# Altium footprint library BBC_Footprints.PcbLib: 171 footprints (part 5 of 11)
Each footprint in its own frame and in the unit in brackets; x right, y up, seen from the top. Pads: shape width x height; smd on the part's side, far side on the other; paste and mask are expansions set on the pad; w line width, h text height; cw(c..) or ccw(c..) is an arc to the next point about the centre after c.
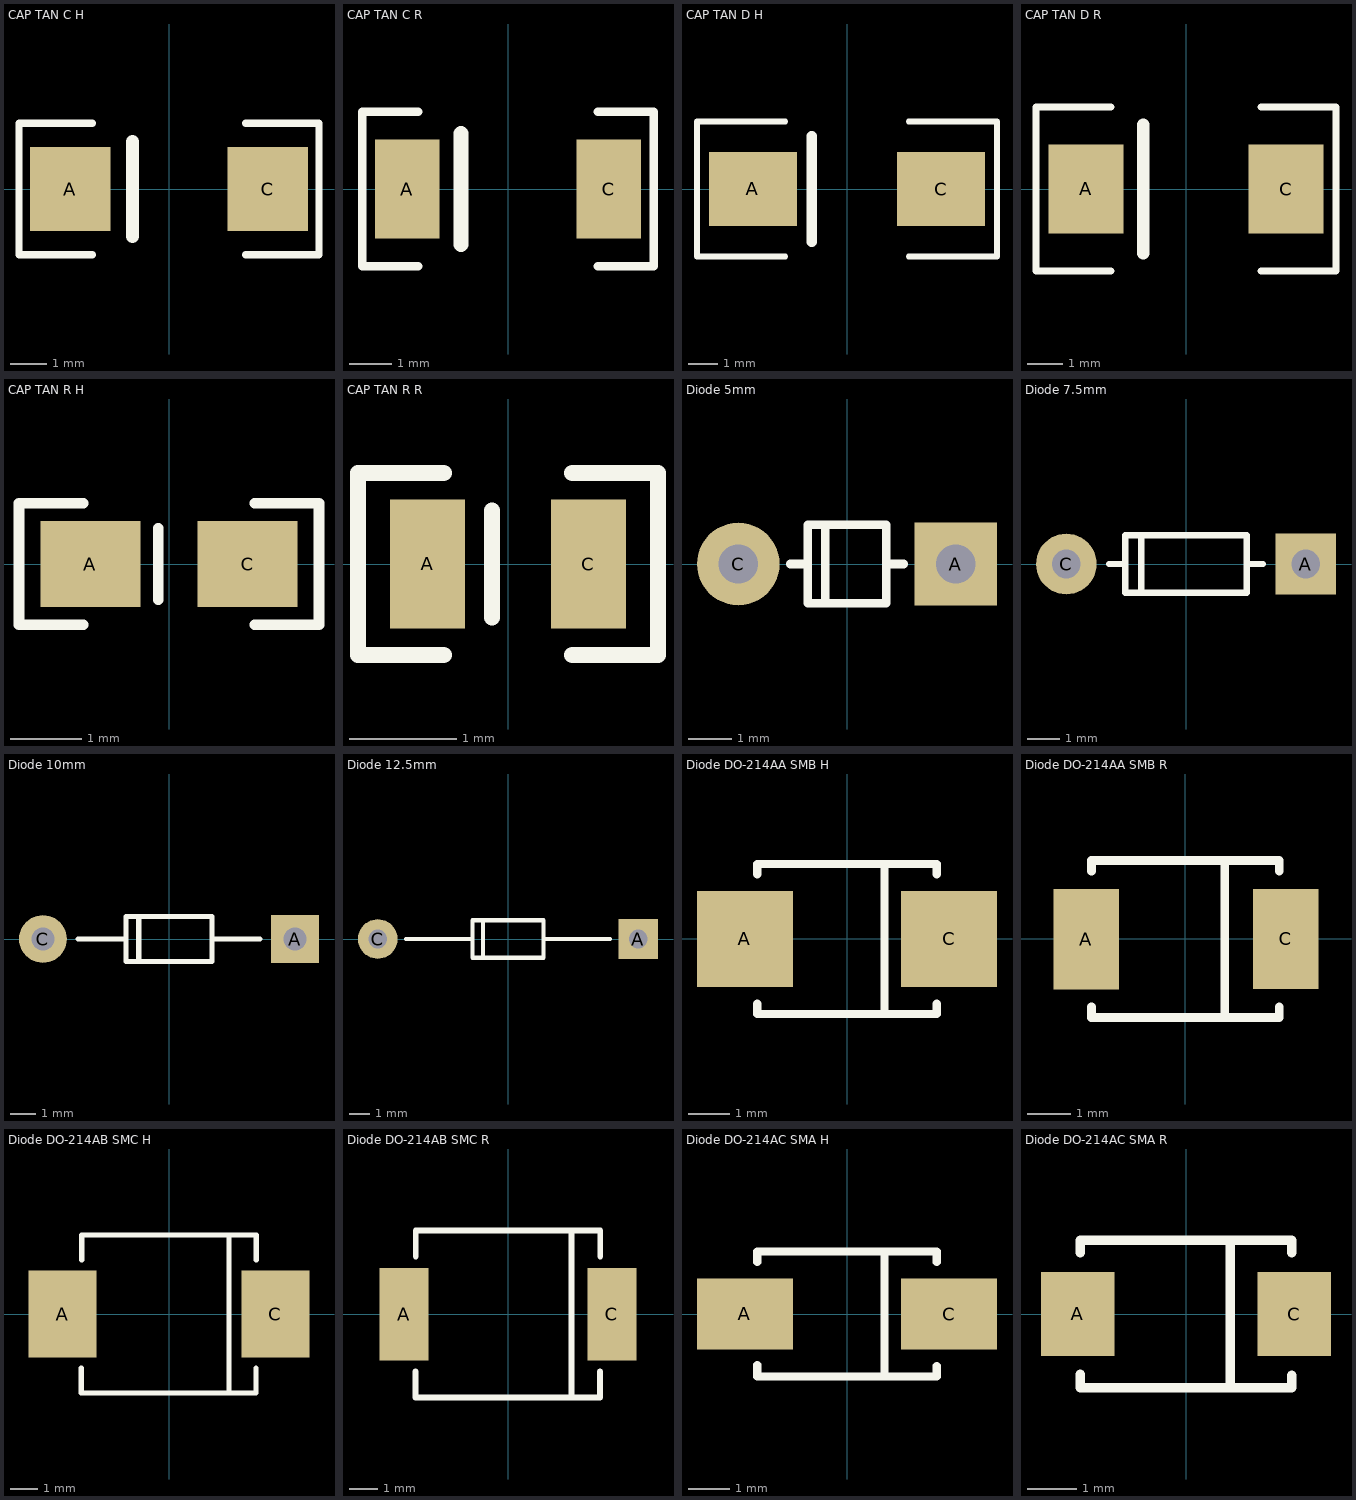
[diagram p4: the footprints below, top view; thin cyan lines are the x and y axes]

## CAP TAN C H [mm] "tantalum chip coapcitor casetype C for hand soldering"
height 2.5
pads (2):
  rect 2.2x2.3 smd: A(-2.7,0) C(2.7,0)
Top Overlay:
  lines w0.2: -2.1,-1.8 -4.1,-1.8 -4.1,1.8 -2.1,1.8 ; 2.1,-1.8 4.1,-1.8 4.1,1.8 2.1,1.8
  lines w0.35: -1,-1.3 -1,1.3
3D body "CAP TAN C.step": height 2.5, standoff 0, extent -3,-1.6 3,1.6

## CAP TAN C R [mm] "tantalum chip coapcitor casetype C for reflow soldering"
height 2.5
pads (2):
  rect 1.5x2.3 smd: A(-2.35,0) C(2.35,0)
Top Overlay:
  lines w0.2: -2.1,-1.8 -3.4,-1.8 -3.4,1.8 -2.1,1.8 ; 2.1,-1.8 3.4,-1.8 3.4,1.8 2.1,1.8
  lines w0.35: -1.1,-1.3 -1.1,1.3
3D body "CAP TAN C.step": height 2.5, standoff 0, extent -3,-1.6 3,1.6

## CAP TAN D H [mm] "tantalum chip coapcitor casetype D for hand soldering"
height 2.8
pads (2):
  rect 3x2.5 smd: A(-3.2,0) C(3.2,0)
Top Overlay:
  lines w0.2: -2.1,-2.3 -5.1,-2.3 -5.1,2.3 -2.1,2.3 ; 2.1,-2.3 5.1,-2.3 5.1,2.3 2.1,2.3
  lines w0.35: -1.2,-1.8 -1.2,1.8
3D body "CAP TAN D.step": height 2.8, standoff 0, extent -3.65,-2.15 3.65,2.15

## CAP TAN D R [mm] "tantalum chip coapcitor casetype D for reflow soldering"
height 2.8
pads (2):
  rect 2.1x2.5 smd: A(-2.8,0) C(2.8,0)
Top Overlay:
  lines w0.2: -2.1,-2.3 -4.2,-2.3 -4.2,2.3 -2.1,2.3 ; 2.1,-2.3 4.2,-2.3 4.2,2.3 2.1,2.3
  lines w0.35: -1.2,-1.8 -1.2,1.8
3D body "CAP TAN D.step": height 2.8, standoff 0, extent -3.65,-2.15 3.65,2.15

## CAP TAN R H [mm] "tantalum chip coapcitor casetype R for hand soldering"
height 2.8
pads (2):
  rect 1.4x1.2 smd: A(-1.1,0) C(1.1,0)
Top Overlay:
  lines w0.15: -1.2,-0.85 -2.1,-0.85 -2.1,0.85 -1.2,0.85 ; -0.15,-0.5 -0.15,0.5 ; 1.2,-0.85 2.1,-0.85 2.1,0.85 1.2,0.85
3D body "CAP TAN R.step": height 1.2, standoff 0, extent -1,-0.65 1,0.65

## CAP TAN R R [mm] "tantalum chip coapcitor casetype R for reflow soldering"
height 2.8
pads (2):
  rect 0.7x1.2 smd: A(-0.75,0) C(0.75,0)
Top Overlay:
  lines w0.15: -0.6,-0.85 -1.4,-0.85 -1.4,0.85 -0.6,0.85 ; -0.15,-0.5 -0.15,0.5 ; 0.6,-0.85 1.4,-0.85 1.4,0.85 0.6,0.85
3D body "CAP TAN R.step": height 1.2, standoff 0, extent -1,-0.65 1,0.65

## Diode 5mm [mm] "Diode for tht mounting with a 5mm pitch"
height 3
pads (2):
  rect 1.9x1.9 hole 0.9: A(2.5,0)
  round 1.9 hole 0.9: C(-2.5,0)
Top Overlay:
  lines w0.2: -1.3,0 -0.9,0 ; -0.5,-0.9 -0.5,0.9 ; 0.9,0 1.3,0 ; -0.9,-0.9 -0.9,0.9 0.9,0.9 0.9,-0.9 -0.9,-0.9
3D body "Diode 5mm.step": height 1.82, standoff -2, extent -2.815,-0.901 2.815,0.901

## Diode 7.5mm [mm] "Diode for tht mounting with a 7.5mm pitch"
height 3
pads (2):
  rect 1.9x1.9 hole 0.9: A(3.75,0)
  round 1.9 hole 0.9: C(-3.75,0)
Top Overlay:
  lines w0.2: -2.4,0 -1.9,0 ; -1.4,-0.9 -1.4,0.9 ; 1.9,0 2.4,0 ; -1.9,-0.9 -1.9,0.9 1.9,0.9 1.9,-0.9 -1.9,-0.9
3D body "Diode 7.5mm.step": height 2.52, standoff -2, extent -4.2,-1.201 4.2,1.201

## Diode 10mm [mm] "Diode for tht mounting with a 10mm pitch"
height 3
pads (2):
  rect 1.9x1.9 hole 0.9: A(5,0)
  round 1.9 hole 0.9: C(-5,0)
Top Overlay:
  lines w0.2: -3.6,0 -1.7,0 ; -1.2,-0.9 -1.2,0.9 ; 1.7,0 3.6,0 ; -1.7,-0.9 1.7,-0.9 1.7,0.9 -1.7,0.9 -1.7,-0.9
3D body "Diode 10mm.step": height 1.82, standoff -2, extent -5.355,-0.901 5.355,0.901

## Diode 12.5mm [mm] "Diode for tht mounting with a 12.5mm pitch"
height 3
pads (2):
  rect 1.9x1.9 hole 0.9: A(6.25,0)
  round 1.9 hole 0.9: C(-6.25,0)
Top Overlay:
  lines w0.2: -4.9,0 -1.7,0 ; -1.2,-0.9 -1.2,0.9 ; 1.7,0 4.9,0 ; -1.7,-0.9 1.7,-0.9 1.7,0.9 -1.7,0.9 -1.7,-0.9
3D body "Diode 12.5mm.step": height 1.82, standoff -2, extent -6.625,-0.901 6.625,0.901

## Diode DO-214AA SMB H [mm] "Diode in DO-214AA (same as SMB) package for hand soldering"
height 2.5
pads (2):
  rect 2.3x2.3 smd: A(-2.45,0) C(2.45,0)
Top Overlay:
  lines w0.2: -2.15,-1.55 -2.15,-1.8 2.15,-1.8 2.15,-1.55 ; -2.15,1.55 -2.15,1.8 2.15,1.8 2.15,1.55 ; 0.9,-1.8 0.9,1.8
3D body "Diode DO-214AA SMB.step": height 2.3, standoff 0, extent -2.7,-1.8 2.7,1.8

## Diode DO-214AA SMB R [mm] "Diode in DO-214AA (same as SMB) package for reflow soldering"
height 2.5
pads (2):
  rect 1.5x2.3 smd: A(-2.271,-0.006) C(2.3,0)
Top Overlay:
  lines w0.2: -2.15,-1.55 -2.15,-1.8 2.15,-1.8 2.15,-1.55 ; -2.15,1.55 -2.15,1.8 2.15,1.8 2.15,1.55 ; 0.9,-1.8 0.9,1.8
3D body "Diode DO-214AA SMB.step": height 2.3, standoff 0, extent -2.7,-1.8 2.7,1.8

## Diode DO-214AB SMC H [mm] "Diode in DO-214AB (same as SMC) package for hand soldering"
height 2.5
pads (2):
  rect 2.5x3.2 smd: A(-3.9,0) C(3.9,0)
Top Overlay:
  lines w0.2: -3.211,-1.992 -3.211,-2.892 3.189,-2.892 3.189,-1.992 ; -3.2,2 -3.2,2.9 3.2,2.9 3.2,2 ; 2.2,-2.85 2.2,2.9
3D body "Diode DO-214AB SMC.step": height 2.3, standoff 0, extent -3.975,-2.95 3.975,2.95

## Diode DO-214AB SMC R [mm] "Diode in DO-214AB (same as SMC) package for reflow soldering"
height 2.5
pads (2):
  rect 1.7x3.2 smd: A(-3.6,0) C(3.6,0)
Top Overlay:
  lines w0.2: -3.211,-1.992 -3.211,-2.892 3.189,-2.892 3.189,-1.992 ; -3.2,2 -3.2,2.9 3.2,2.9 3.2,2 ; 2.2,-2.85 2.2,2.9
3D body "Diode DO-214AB SMC.step": height 2.3, standoff 0, extent -3.975,-2.95 3.975,2.95

## Diode DO-214AC SMA H [mm] "Diode in DO-214AC (same as SMA) package for hand soldering"
height 2.5
pads (2):
  rect 2.3x1.7 smd: A(-2.45,0) C(2.45,0)
Top Overlay:
  lines w0.2: -2.15,-1.5 2.15,-1.5 2.15,-1.25 ; -2.15,-1.475 -2.15,-1.225 ; -2.15,1.25 -2.15,1.5 2.15,1.5 ; 0.9,-1.5 0.9,1.5 ; 2.15,1.25 2.15,1.475
3D body "Diode DO-214AC SMA.step": height 2.4, standoff 0, extent -2.6,-1.3 2.6,1.3

## Diode DO-214AC SMA R [mm] "Diode in DO-214AC (same as SMA) package for reflow soldering"
height 2.5
pads (2):
  rect 1.5x1.7 smd: A(-2.2,0) C(2.2,0)
Top Overlay:
  lines w0.2: -2.15,-1.5 2.15,-1.5 2.15,-1.25 ; -2.15,-1.475 -2.15,-1.225 ; -2.15,1.25 -2.15,1.5 2.15,1.5 ; 0.9,-1.5 0.9,1.5 ; 2.15,1.25 2.15,1.475
3D body "Diode DO-214AC SMA.step": height 2.4, standoff 0, extent -2.6,-1.3 2.6,1.3